# Altium footprint library Connectors.PcbLib: 92 footprints (part 2 of 6)
Each footprint in its own frame and in the unit in brackets; x right, y up, seen from the top. Pads: shape width x height; smd on the part's side, far side on the other; paste and mask are expansions set on the pad; w line width, h text height; cw(c..) or ccw(c..) is an arc to the next point about the centre after c.
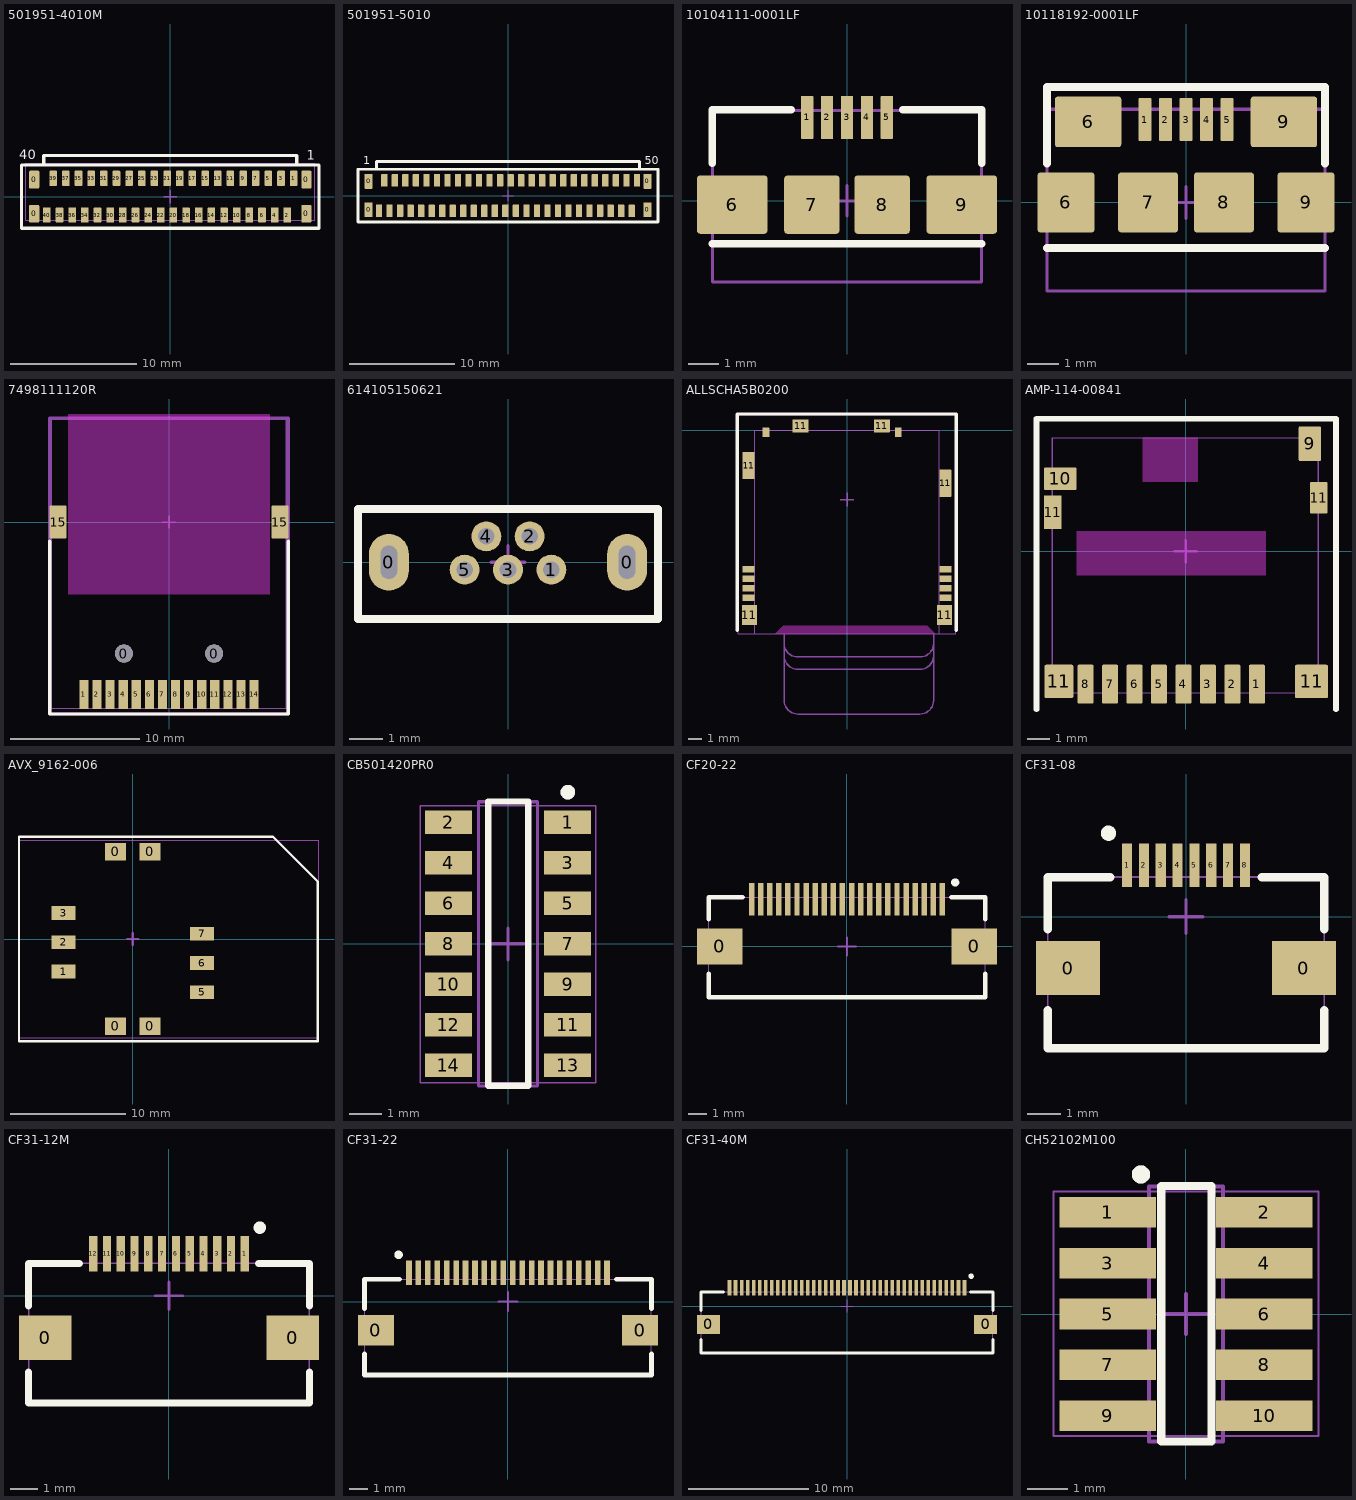
[diagram p1: the footprints below, top view; thin cyan lines are the x and y axes]

## 501951-4010M [mm] "0.50mm Pitch Easy-On™ Type FFC/FPC Connector, Vertical, Surface Mount, Gold Plating, 40 Circuits, Mirrored"
height 4.34
pads (44):
  rrect20% 0.8x1.4 smd: 0(-10.75,-1.35) 0(-10.75,1.35) 0(10.75,-1.35) 0(10.75,1.35)
  rrect20% 0.6x1.2 smd: 1(9.75,1.45) 2(9.25,-1.45) 3(8.75,1.45) 4(8.25,-1.45) 5(7.75,1.45) 6(7.25,-1.45) 7(6.75,1.45) 8(6.25,-1.45) 9(5.75,1.45) 10(5.25,-1.45) 11(4.75,1.45) 12(4.25,-1.45) 13(3.75,1.45) 14(3.25,-1.45) 15(2.75,1.45) 16(2.25,-1.45) 17(1.75,1.45) 18(1.25,-1.45) 19(0.75,1.45) 20(0.25,-1.45) 21(-0.25,1.45) 22(-0.75,-1.45) 23(-1.25,1.45) 24(-1.75,-1.45) 25(-2.25,1.45) 26(-2.75,-1.45) 27(-3.25,1.45) 28(-3.75,-1.45) 29(-4.25,1.45) 30(-4.75,-1.45) 31(-5.25,1.45) 32(-5.75,-1.45) 33(-6.25,1.45) 34(-6.75,-1.45) 35(-7.25,1.45) 36(-7.75,-1.45) 37(-8.25,1.45) 38(-8.75,-1.45) 39(-9.25,1.45) 40(-9.75,-1.45)
Top Overlay:
  lines w0.254: -10,2.5 -10,3.25 10,3.25 10,2.5 ; -11.75,-2.5 -11.75,2.5 11.75,2.5 11.75,-2.5 -11.75,-2.5
  text "40" at -11.95,2.95 h0.76
  text "1" at 10.8,2.9 h0.76
Mechanical 13:
  text ".Designator" at -10,3.5 h0.51
  text ".Comment" at -4,3.5 h0.51
Mechanical 15:
  lines w0.05: -11.4,-1.85 -11.4,2.65 11.4,2.65 11.4,-1.85 -11.4,-1.85
  lines w0.1: -0.5,0 0.5,0 -0.5,0 ; 0,-0.5 0,0.5 0,-0.5
3D body "5019514010.stp": height 4.05, standoff 0, extent -11.4,-1.85 11.4,2.65

## 501951-5010 [mm] "0.50mm Pitch Easy-On™ Type FFC/FPC Connector, Vertical, Surface Mount, Gold Plating, 50 Circuits"
height 4.34
pads (54):
  rrect20% 0.8x1.4 smd: 0(-13.25,-1.35) 0(-13.25,1.35) 0(13.25,-1.35) 0(13.25,1.35)
  rrect20% 0.6x1.2 smd: 1(-12.25,-1.45) 2(-11.75,1.45) 3(-11.25,-1.45) 4(-10.75,1.45) 5(-10.25,-1.45) 6(-9.75,1.45) 7(-9.25,-1.45) 8(-8.75,1.45) 9(-8.25,-1.45) 10(-7.75,1.45) 11(-7.25,-1.45) 12(-6.75,1.45) 13(-6.25,-1.45) 14(-5.75,1.45) 15(-5.25,-1.45) 16(-4.75,1.45) 17(-4.25,-1.45) 18(-3.75,1.45) 19(-3.25,-1.45) 20(-2.75,1.45) 21(-2.25,-1.45) 22(-1.75,1.45) 23(-1.25,-1.45) 24(-0.75,1.45) 25(-0.25,-1.45) 26(0.25,1.45) 27(0.75,-1.45) 28(1.25,1.45) 29(1.75,-1.45) 30(2.25,1.45) 31(2.75,-1.45) 32(3.25,1.45) 33(3.75,-1.45) 34(4.25,1.45) 35(4.75,-1.45) 36(5.25,1.45) 37(5.75,-1.45) 38(6.25,1.45) 39(6.75,-1.45) 40(7.25,1.45) 41(7.75,-1.45) 42(8.25,1.45) 43(8.75,-1.45) 44(9.25,1.45) 45(9.75,-1.45) 46(10.25,1.45) 47(10.75,-1.45) 48(11.25,1.45) 49(11.75,-1.45) 50(12.25,1.45)
Top Overlay:
  lines w0.254: -12.5,2.5 -12.5,3.25 12.5,3.25 12.5,2.5 ; -14.25,-2.5 -14.25,2.5 14.25,2.5 14.25,-2.5 -14.25,-2.5
  text "50" at 13,3 h0.76
  text "1" at -13.75,3 h0.76
Mechanical 13:
  text ".Designator" at -12.5,3.5 h0.51
  text ".Comment" at -6.5,3.5 h0.51
Mechanical 15:
  lines w0.1: -0.5,0 0.5,0 ; 0,-0.5 0,0.5
3D body "5019515010.step": height 4.05, standoff 0, extent -13.9,-1.85 13.9,2.65
3D body "5019515010-1.step": height 4.05, standoff 0, extent -13.9,-1.85 13.9,2.65

## 10104111-0001LF [mm] "MicroUSB A/B SMT"
height 3.07
pads (9):
  rrect10% 0.4x1.4 smd: 1(-1.3,2.725) 2(-0.65,2.725) 3(0,2.725) 4(0.65,2.725) 5(1.3,2.725)
  rrect10% 2.3x1.9 smd: 6(-3.75,-0.125) 9(3.75,-0.125)
  rrect10% 1.8x1.9 smd: 7(-1.15,-0.125) 8(1.15,-0.125)
Top Overlay:
  lines w0.254: -4.4,-1.4 4.4,-1.4 ; -4.399,1.225 -4.399,2.975 -4.399,2.975 -1.825,2.975 ; 1.825,2.975 4.399,2.975 ; 4.399,1.225 4.399,2.975
Mechanical 13:
  lines w0.1: -4.4,-2.65 3.55,-2.65 4.4,-2.65 4.4,2.95 -4.4,2.95 -4.4,-2.65
  text ".Designator" at -4.5,4.375 h0.51
  text ".Comment" at -4.5,3.7 h0.51
Mechanical 15:
  lines w0.1: -0.5,0 0.5,0 ; 0,-0.5 0,0.5
3D body "10104111-0001LF-1.step": height 2.81, standoff -0.26, extent -4.4,-2.651 4.4,2.974

## 10118192-0001LF [mm] "MicroUSB B SMT"
height 2.8
pads (11):
  rrect10% 0.4x1.35 smd: 1(-1.3,2.625) 2(-0.65,2.625) 3(0,2.625) 4(0.65,2.625) 5(1.3,2.625)
  rrect10% 1.8x1.9 smd: 6(-3.8,0) 9(3.8,0)
  rrect10% 2.1x1.6 smd: 6(-3.1,2.55) 9(3.1,2.55)
  rrect10% 1.9x1.9 smd: 7(-1.2,0) 8(1.2,0)
Top Overlay:
  lines w0.254: -4.4,-1.45 4.4,-1.45 ; -4.399,1.225 -4.399,3.65 0,3.65 4.399,3.65 4.399,1.225
Mechanical 13:
  lines w0.1: -4.4,-2.8 3.4,-2.8 4.4,-2.8 4.4,2.95 -4.4,2.95 -4.4,-2.8
  text ".Designator" at -4.5,4.375 h0.51
  text ".Comment" at -4.5,3.7 h0.51
Mechanical 15:
  lines w0.1: -0.5,0 0.5,0 ; 0,-0.5 0,0.5
3D body "10118192.STEP": height 2.75, standoff -0.26, extent -3.956,-2.75 3.956,2.911

## 7498111120R [mil] "Gbit ethernet connector with magnetics, LED, SMD"
height 350
pads (18):
  round 55 hole 55 unplated: 0(-138,-402) 0(138,-402)
  rrect10% 28x90 smd: 1(-260,-527) 2(-220,-527) 3(-180,-527) 4(-140,-527) 5(-100,-527) 6(-60,-527) 7(-20,-527) 8(20,-527) 9(60,-527) 10(100,-527) 11(140,-527) 12(180,-527) 13(220,-527) 14(260,-527)
  rrect10% 51.06x100 smd: 15(-338.94,0) 15(338.94,0)
Top Overlay:
  lines w10: -364.17,-59.06 -364.17,-586.61 364.17,-586.61 364.17,-59.06
Keep-Out Layer:
  board cut-out: -307.52,-220 -307.5,330 307.52,330 307.52,-220
Mechanical 13:
  lines w10: -364.17,-586.61 364.17,-586.61 364.17,316.93 -364.17,316.93 -364.17,-586.61
  text ".Designator" at -108.27,15.75 h20
  text ".Comment" at -78.74,-23.62 h20
Mechanical 15:
  lines w1.97: -358.27,-568.9 358.27,-568.9 358.27,316.93 -358.27,316.93 -358.27,-568.9
  lines w3.94: -19.68,0 19.68,0 ; 0,-19.69 0,19.68
3D body "7498111120R-1.step": height 397.64, standoff -125.98, extent -357.08,-568.66 357.49,316.38

## 614105150621 [mm] "microUSB AB 2.0 connector Female, ThruHole"
height 5.5
pads (7):
  rrect100% 1.2x1.7 hole 0.5 slot 1 at 90 deg: 0(-3.575,0) 0(3.575,0)
  round 0.9 hole 0.5: 1(1.3,-0.22) 2(0.65,0.78) 3(0,-0.22) 4(-0.65,0.78) 5(-1.3,-0.22)
Top Overlay:
  lines w0.254: -4.5,-1.7 4.5,-1.7 4.5,1.6 -4.5,1.6 -4.5,-1.7
Mechanical 13:
  lines w0.1: -4.5,-1.7 -4.5,1.6 4.5,1.6 4.5,-1.7 -4.5,-1.7
  text ".Designator" at -4.9,2.3 h0.51
  text ".Comment" at 1.4,2.3 h0.51
Mechanical 15:
  lines w0.1: -0.5,0 0.5,0 ; 0,-0.5 0,0.5 ; -4.5,-1.7 4.5,-1.7 4.5,1.6 -4.5,1.6 -4.5,-1.7
3D body "614105150621-rev1.stp": height 5.61, standoff -1.5, extent -4,-1.545 4,1.355

## ALLSCHA5B0200 [mm] "uSD socket, push in, push out, SMT"
height 1.55
pads (16):
  rrect10% 0.9x0.45 smd: 1(-7.25,-10.235) 2(-7.25,-10.935) 3(-7.25,-11.635) 4(-7.25,-12.335) 5(7.25,-12.335) 6(7.25,-11.635) 7(7.25,-10.935) 8(7.25,-10.235)
  rrect10% 0.5x0.7 smd: 9(3.775,-0.15) 10(-5.975,-0.15)
  rrect10% 0.9x2 smd: 11(-7.25,-2.6) 11(7.25,-3.9)
  rrect10% 1.1x1.5 smd: 11(-7.187,-13.61) 11(7.187,-13.61)
  rrect10% 1.2x0.95 smd: 11(-3.425,0.325) 11(2.575,0.325)
Top Overlay:
  lines w0.254: -8.075,-14.75 -8.075,1.2 8.05,1.2 8.05,-14.75
Keep-Out Layer:
  board cut-out: -4.7,-14.4 -5.3,-15 6.5,-15 5.9,-14.4
Mechanical 13:
  lines w0.05: -6.8,-15 6.8,-15 6.8,0 -6.8,0 -6.8,-15
  lines w0.1: -4.625,-16.6 ccw(c-3.625,-16.6) -3.625,-17.6 5.375,-17.6 ccw(c5.375,-16.6) 6.375,-16.6 ; -4.625,-15.7 ccw(c-3.625,-15.7) -3.625,-16.7 5.375,-16.7 ccw(c5.375,-15.7) 6.375,-15.7 ; -4.625,-15 -4.625,-19.9 ccw(c-3.625,-19.9) -3.625,-20.9 5.375,-20.9 ccw(c5.375,-19.9) 6.375,-19.9 6.375,-15
  text ".Designator" at -3.045,-7.95 h0.51
  text ".Comment" at -3.02,-8.65 h0.51
Mechanical 15:
  lines w0.05: -8,-15 8,-15 8,1.15 -8,1.15 -8,-15
  lines w0.1: -0.5,-5.1 0.5,-5.1 ; 0,-5.6 0,-4.6
3D body "SCHA5B0200.STEP": height 1.51, standoff 0, extent -7.5,-14.975 7.5,0.525

## AMP-114-00841 [mm] "uSD socket, push in, pull out, SMT"
height 1.55
pads (14):
  rrect10% 0.7x1.75 smd: 1(3.2,-5.975) 2(2.1,-5.975) 3(1,-5.975) 4(-0.1,-5.975) 5(-1.2,-5.975) 6(-2.3,-5.975) 7(-3.4,-5.975) 8(-4.5,-5.975)
  rrect10% 1x1.55 smd: 9(5.575,4.825)
  rrect10% 1.475x1 smd: 10(-5.638,3.25)
  rrect10% 0.8x1.5 smd: 11(-5.975,1.75)
  rrect10% 1.3x1.5 smd: 11(-5.7,-5.85)
  rrect10% 1.5x1.5 smd: 11(5.65,-5.85)
  rrect10% 0.8x1.4 smd: 11(5.975,2.4)
Top Layer keep-out:
  rectangle: -1.95,3.1 0.55,5.1
  rectangle: -4.9,-1.1 3.6,0.9
Top Overlay:
  lines w0.254: -6.7,-7.1 -6.7,5.95 6.75,5.95 6.75,-7.1
Mechanical 13:
  lines w0.05: -6,-6.35 -6,5.1 5.95,5.1 5.95,-6.35 -6,-6.35
  text ".Comment" at -3.02,-3.55 h0.51
  text ".Designator" at -3.045,-2.85 h0.51
Mechanical 15:
  lines w0.05: -5.975,-6.35 -5.975,5.1 5.975,5.1 5.975,-6.35 -5.975,-6.35
  lines w0.1: -0.5,0 0.5,0 ; 0,-0.5 0,0.5
3D body: height 1.55, standoff 0, extent -5.975,-6.35 5.975,5.1

## AVX_9162-006 [mm] "SIM Card holder"
height 1.9
pads (10):
  rect 1.8x1.5 smd: 0(-1.5,-7.6) 0(-1.5,7.6) 0(1.5,-7.6) 0(1.5,7.6)
  rect 2.1x1.2 smd: 1(-6.02,-2.83) 2(-6.02,-0.29) 3(-6.02,2.25) 5(6.03,-4.63) 6(6.03,-2.09) 7(6.03,0.45)
Top Overlay:
  lines w0.2: -9.9,-8.9 -9.9,8.9 12.2,8.9 16.1,5 16.1,-8.9 -9.9,-8.9
Mechanical 13:
  lines w0.1: -9.9,-8.9 16.1,-8.9 16.1,5 12.2,8.9 -9.9,8.9 -9.9,-8.9
  text ".Designator" at -2.395,1.25 h0.51
  text ".Comment" at -2.37,0.55 h0.51
Mechanical 15:
  lines w0.05: -9.9,-8.6 -9.9,8.6 16.2,8.6 16.2,-8.6 -9.9,-8.6
  lines w0.2: -0.5,0 0.5,0 ; 0,-0.5 0,0.5
3D body "AVX Interconnect-9162-400-card.STEP": height 1.68, standoff -0.01, extent -9.695,-8.298 15.99,8.402

## CB501420PR0 [mil]
pads (14):
  rect 58x29 smd: 1(73.5,150) 2(-73.5,150) 3(73.5,100) 4(-73.5,100) 5(73.5,50) 6(-73.5,50) 7(73.5,0) 8(-73.5,0) 9(73.5,-50) 10(-73.5,-50) 11(73.5,-100) 12(-73.5,-100) 13(73.5,-150) 14(-73.5,-150)
Top Overlay:
  circle w10: c73.82,187.01 r3.94
  lines w7.87: -24.29,-175 24.93,-175 24.93,175.59 -24.29,175.59 -24.29,-175
Mechanical 13:
  circle w10: c73.82,187.01 r3.94
  lines w3.94: -36.42,-175.2 36.42,-175.2 36.42,175.2 -36.42,175.2 -36.42,-175.2
  text ".Comment" at -25.59,47.24 h20
  text ".Designator" at 1.97,48.23 h20
Mechanical 15:
  lines w1.97: -108.27,-171.26 108.27,-171.26 108.27,170.28 -108.27,170.28 -108.27,-171.26
  lines w3.94: -19.68,0 19.68,0 ; 0,-19.69 0,19.68
3D body "Samtec-CLP-107-02-L-D2.STEP": height 88.5, standoff 0, extent -85,-183.49 85,183.51

## CF20-22 [mm] "FPC 22pin 0.5mm right angle, top contacts"
height 2
pads (24):
  rect 2.5x2 smd: 0(-7,0) 0(7,0)
  rrect10% 0.3x1.8 smd: 1(5.25,2.6) 2(4.75,2.6) 3(4.25,2.6) 4(3.75,2.6) 5(3.25,2.6) 6(2.75,2.6) 7(2.25,2.6) 8(1.75,2.6) 9(1.25,2.6) 10(0.75,2.6) 11(0.25,2.6) 12(-0.25,2.6) 13(-0.75,2.6) 14(-1.25,2.6) 15(-1.75,2.6) 16(-2.25,2.6) 17(-2.75,2.6) 18(-3.25,2.6) 19(-3.75,2.6) 20(-4.25,2.6) 21(-4.75,2.6) 22(-5.25,2.6)
Top Overlay:
  circle w0.254: c5.95,3.525 r0.1
  lines w0.254: -7.6,-1.5 -7.6,-2.8 7.6,-2.8 7.6,-1.5 ; -7.6,1.5 -7.6,2.7 -5.75,2.7 ; 5.75,2.7 7.6,2.7 7.6,1.5
Mechanical 13:
  lines w0.1: -7.6,-1.5 -7.6,-2.8 7.6,-2.8 7.6,-1.5 ; -7.6,1.5 -7.6,2.7 -5.75,2.7 ; 5.75,2.7 7.6,2.7 7.6,1.5
  text ".Comment" at -2.425,-0.4 h0.51
  text ".Designator" at -2.45,0.3 h0.51
Mechanical 15:
  lines w0.05: -7.6,-2.8 -7.6,2.7 7.6,2.7 7.6,-2.8 -7.6,-2.8
  lines w0.1: -0.5,0 0.5,0 ; 0,-0.5 0,0.5

## CF31-08 [mm] "FPC 8pin 0.5mm right angle, bottom contacts"
height 1.95
pads (10):
  rect 1.9x1.6 smd: 0(-3.5,-1.525) 0(3.5,-1.525)
  rrect10% 0.3x1.3 smd: 1(-1.75,1.525) 2(-1.25,1.525) 3(-0.75,1.525) 4(-0.25,1.525) 5(0.25,1.525) 6(0.75,1.525) 7(1.25,1.525) 8(1.75,1.525)
Top Overlay:
  circle w0.254: c-2.3,2.475 r0.1
  lines w0.254: -4.1,-2.775 -4.1,-3.9 0,-3.9 4.1,-3.9 4.1,-2.775 ; -4.1,-0.375 -4.1,1.175 -2.25,1.175 ; 2.25,1.175 4.1,1.175 4.1,-0.375
Mechanical 13:
  lines w0.1: -4.1,-2.75 -4.1,-3.895 0,-3.895 4.1,-3.895 4.1,-2.75 ; -4.1,-0.375 -4.1,1.175 -2.25,1.175 ; 2.25,1.175 4.1,1.175 4.1,-0.375
  text ".Comment" at -1.575,-1.725 h0.51
  text ".Designator" at -1.6,-1.025 h0.51
Mechanical 15:
  lines w0.05: -4.1,-3.895 -4.1,1.175 4.1,1.175 4.1,-3.895 -4.1,-3.895
  lines w0.1: -0.5,0 0.5,0 ; 0,-0.5 0,0.5
3D body "CF3108XD0R0-05.step": height 1.96, standoff 0, extent -4.15,-3.995 4.15,1.775

## CF31-12M [mm] "FPC 12pin 0.5mm right angle, bottom contacts, mirrored"
height 1.95
pads (14):
  rect 1.9x1.6 smd: 0(-4.5,-1.525) 0(4.5,-1.525)
  rrect10% 0.3x1.3 smd: 1(2.75,1.525) 2(2.25,1.525) 3(1.75,1.525) 4(1.25,1.525) 5(0.75,1.525) 6(0.25,1.525) 7(-0.25,1.525) 8(-0.75,1.525) 9(-1.25,1.525) 10(-1.75,1.525) 11(-2.25,1.525) 12(-2.75,1.525)
Top Overlay:
  circle w0.254: c3.3,2.475 r0.1
  lines w0.254: -5.1,-2.775 -5.1,-3.9 0,-3.9 5.1,-3.9 5.1,-2.775 ; -5.1,-0.375 -5.1,1.175 -3.25,1.175 ; 3.25,1.175 5.1,1.175 5.1,-0.375
Mechanical 13:
  lines w0.1: -5.1,-2.75 -5.1,-3.895 0,-3.895 5.1,-3.895 5.1,-2.75 ; -5.1,-0.375 -5.1,1.175 -3.25,1.175 ; 3.25,1.175 5.1,1.175 5.1,-0.375
  text ".Designator" at -2.6,-1.025 h0.51
  text ".Comment" at -2.575,-1.725 h0.51
Mechanical 15:
  lines w0.05: -5.1,-3.895 5.1,-3.895 5.1,1.175 -5.1,1.175 -5.1,-3.895
  lines w0.1: -0.5,0 0.5,0 ; 0,-0.5 0,0.5
3D body "CF3112XD0R0-05.step": height 1.95, standoff -0.01, extent -5.15,-3.995 5.15,1.775

## CF31-22 [mm] "FPC 22pin 0.5mm right angle, bottom contacts"
height 1.95
pads (24):
  rect 1.9x1.6 smd: 0(-7,-1.525) 0(7,-1.525)
  rrect10% 0.3x1.3 smd: 1(-5.25,1.525) 2(-4.75,1.525) 3(-4.25,1.525) 4(-3.75,1.525) 5(-3.25,1.525) 6(-2.75,1.525) 7(-2.25,1.525) 8(-1.75,1.525) 9(-1.25,1.525) 10(-0.75,1.525) 11(-0.25,1.525) 12(0.25,1.525) 13(0.75,1.525) 14(1.25,1.525) 15(1.75,1.525) 16(2.25,1.525) 17(2.75,1.525) 18(3.25,1.525) 19(3.75,1.525) 20(4.25,1.525) 21(4.75,1.525) 22(5.25,1.525)
Top Overlay:
  circle w0.254: c-5.8,2.475 r0.1
  lines w0.254: -7.6,-2.775 -7.6,-3.9 7.6,-3.9 7.6,-2.775 ; -7.6,-0.375 -7.6,1.175 -5.75,1.175 ; 5.75,1.175 7.6,1.175 7.6,-0.375
Mechanical 13:
  lines w0.1: -7.6,-2.75 -7.6,-3.895 7.6,-3.895 7.6,-2.75 ; -7.6,-0.375 -7.6,1.175 -5.75,1.175 ; 5.75,1.175 7.6,1.175 7.6,-0.375
  text ".Designator" at -2.45,-1.225 h0.51
  text ".Comment" at -2.425,-1.925 h0.51
Mechanical 15:
  lines w0.05: -7.6,-3.895 7.6,-3.895 7.6,1.175 -7.6,1.175 -7.6,-3.895
  lines w0.1: -0.5,0 0.5,0 ; 0,-0.5 0,0.5

## CF31-40M [mm] "FPC 40pin 0.5mm right angle, bottom contacts, mirrored"
height 1.95
pads (42):
  rect 1.9x1.6 smd: 0(-11.5,-1.525) 0(11.5,-1.525)
  rrect10% 0.3x1.3 smd: 1(9.75,1.525) 2(9.25,1.525) 3(8.75,1.525) 4(8.25,1.525) 5(7.75,1.525) 6(7.25,1.525) 7(6.75,1.525) 8(6.25,1.525) 9(5.75,1.525) 10(5.25,1.525) 11(4.75,1.525) 12(4.25,1.525) 13(3.75,1.525) 14(3.25,1.525) 15(2.75,1.525) 16(2.25,1.525) 17(1.75,1.525) 18(1.25,1.525) 19(0.75,1.525) 20(0.25,1.525) 21(-0.25,1.525) 22(-0.75,1.525) 23(-1.25,1.525) 24(-1.75,1.525) 25(-2.25,1.525) 26(-2.75,1.525) 27(-3.25,1.525) 28(-3.75,1.525) 29(-4.25,1.525) 30(-4.75,1.525) 31(-5.25,1.525) 32(-5.75,1.525) 33(-6.25,1.525) 34(-6.75,1.525) 35(-7.25,1.525) 36(-7.75,1.525) 37(-8.25,1.525) 38(-8.75,1.525) 39(-9.25,1.525) 40(-9.75,1.525)
Top Overlay:
  circle w0.254: c10.3,2.475 r0.1
  lines w0.254: -12.1,-2.775 -12.1,-3.9 0,-3.9 12.1,-3.9 12.1,-2.775 ; -12.1,-0.375 -12.1,1.175 -10.25,1.175 ; 10.25,1.175 12.1,1.175 12.1,-0.375
Mechanical 13:
  lines w0.1: -12.1,-2.75 -12.1,-3.895 0,-3.895 12.1,-3.895 12.1,-2.75 ; -12.1,-0.375 -12.1,1.175 -10.25,1.175 ; 10.25,1.175 12.1,1.175 12.1,-0.375
  text ".Designator" at -2.45,-1.225 h0.51
  text ".Comment" at -2.425,-1.925 h0.51
Mechanical 15:
  lines w0.05: -12.1,-3.895 12.1,-3.895 12.1,1.175 -12.1,1.175 -12.1,-3.895
  lines w0.1: -0.5,0 0.5,0 ; 0,-0.5 0,0.5
3D body "CF3140XD0R0-05.step": height 2.01, standoff 0, extent -12.12,-3.995 12.15,1.875

## CH52102M100 [mm]
height 5.5
pads (10):
  rect 2.4x0.762 smd: 1(-1.95,2.54) 2(1.95,2.54) 3(-1.95,1.27) 4(1.95,1.27) 5(-1.95,0) 6(1.95,0) 7(-1.95,-1.27) 8(1.95,-1.27) 9(-1.95,-2.54) 10(1.95,-2.54)
Top Overlay:
  circle w0.254: c-1.125,3.48 r0.1
  lines w0.2: -0.617,-3.18 0.633,-3.18 0.633,3.19 -0.617,3.19 -0.617,-3.18
Mechanical 13:
  circle w0.254: c-1.125,3.48 r0.1
  lines w0.1: -0.925,-3.18 -0.925,3.18 0.925,3.18 0.925,-3.18 -0.925,-3.18
  text ".Comment" at -0.65,2.724 h0.51
  text ".Designator" at 0.05,2.749 h0.51
Mechanical 15:
  lines w0.05: -3.3,-3.048 3.3,-3.048 3.3,3.055 -3.3,3.055 -3.3,-3.048
  lines w0.1: -0.5,0 0.5,0 ; 0,-0.5 0,0.5
3D body "Samtec-FTSH-105-01-F-DV.stp": height 5.97, standoff 0, extent -2.921,-3.175 2.921,3.175